# Altium footprint library SMD-RCL.PcbLib: 111 footprints (part 3 of 7)
Each footprint in its own frame and in the unit in brackets; x right, y up, seen from the top. Pads: shape width x height; smd on the part's side, far side on the other; paste and mask are expansions set on the pad; w line width, h text height; cw(c..) or ccw(c..) is an arc to the next point about the centre after c.
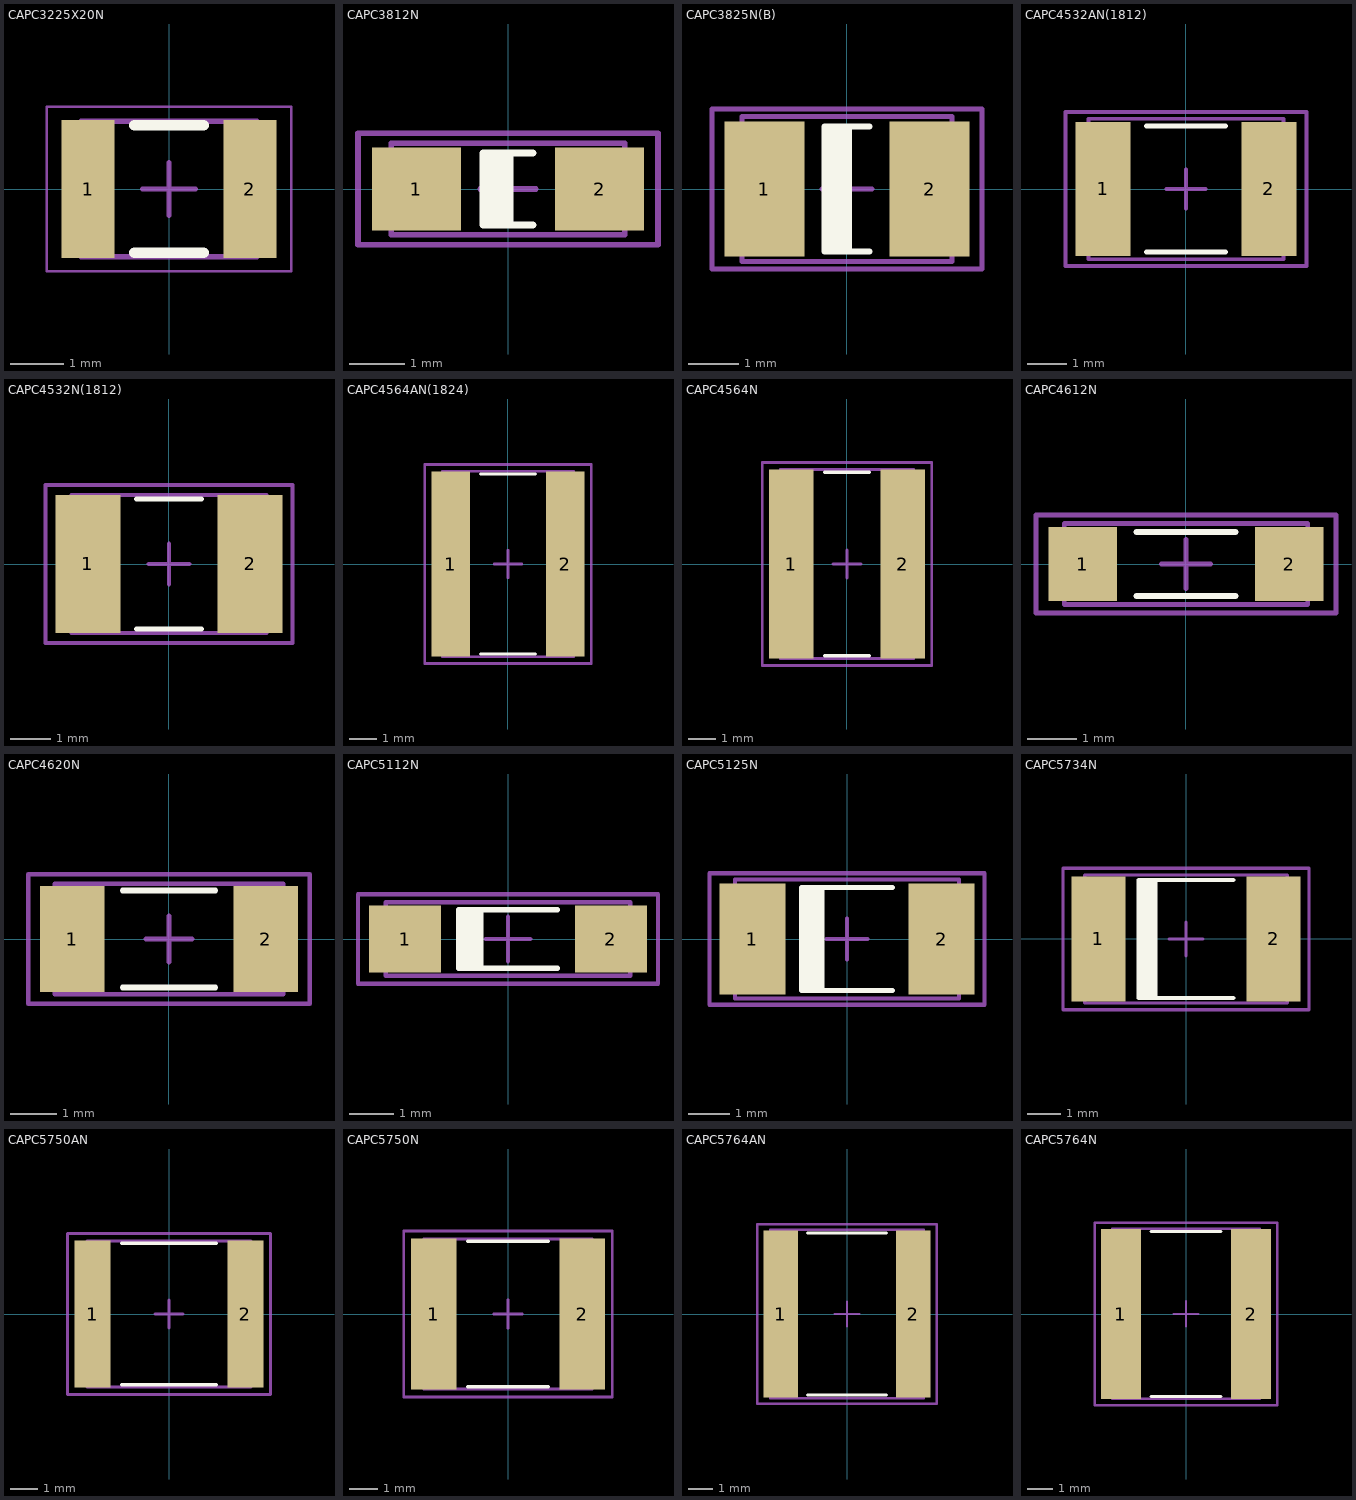
[diagram p2: the footprints below, top view; thin cyan lines are the x and y axes]

## CAPC3225X20N [mm] "Chip Capacitor, 2-Leads, Body 3,25x2,50mm, IPC Medium Density"
height 2
pads (2):
  rect 1x2.6 smd: 1(-1.525,0) 2(1.525,0)
Top Overlay:
  lines w0.2: -0.65,-1.2 0.65,-1.2 ; -0.65,1.2 0.65,1.2
Assembly_draw:
  lines w0.1: -1.65,-1.275 1.65,-1.275 1.65,1.275 -1.65,1.275 -1.65,-1.275
Mechanical_clearance:
  lines w0.05: -2.3,-1.55 2.3,-1.55 2.3,1.55 -2.3,1.55 -2.3,-1.55
  lines w0.1: -0.5,0 0.5,0 ; 0,-0.5 0,0.5
3D body "CAPC3225X20N.step": height 2, standoff 0, extent -1.65,-1.275 1.65,1.275

## CAPC3812N [mm] "Chip Capacitor, Body 3.81x1.27mm, IPC Medium Density"
height 1.66
pads (2):
  rect 1.6x1.5 smd: 1(-1.65,0) 2(1.65,0)
Top Overlay:
  rectangle: -0.45,-0.65 0.1,0.65
  lines w0.125: 0.45,-0.65 -0.45,-0.65 -0.45,0.65 0.45,0.65
Assembly_draw:
  lines w0.1: -2.1,-0.825 -2.1,0.825 2.1,0.825 2.1,-0.825 -2.1,-0.825
Mechanical_clearance:
  lines w0.1: -0.5,0 0.5,0 ; 0,-0.5 0,0.5 ; -2.7,-1 -2.7,1 2.7,1 2.7,-1 -2.7,-1
3D body: height 1.66, standoff 0, extent -2.1,-0.825 2.1,0.825

## CAPC3825N(B) [mm] "Chip Capacitor, Body 3.81x2.54mm, IPC Medium Density"
height 1.66
pads (2):
  rect 1.6x2.7 smd: 1(-1.65,0) 2(1.65,0)
Top Overlay:
  rectangle: -0.45,-1.25 0.1,1.25
  lines w0.125: 0.45,-1.25 -0.45,-1.25 -0.45,1.25 0.45,1.25
Assembly_draw:
  lines w0.1: -2.1,-1.45 2.1,-1.45 2.1,1.45 -2.1,1.45 -2.1,-1.45
Mechanical_clearance:
  lines w0.1: -0.5,0 0.5,0 ; 0,-0.5 0,0.5 ; -2.7,-1.6 2.7,-1.6 2.7,1.6 -2.7,1.6 -2.7,-1.6
3D body: height 1.66, standoff 0, extent -2.1,-1.45 2.1,1.45

## CAPC4532AN(1812) [mm] "Chip Capacitor, Body 4.5x3.2mm, IPC Medium Density"
height 2.03
pads (2):
  rect 1.4x3.4 smd: 1(-2.1,0) 2(2.1,0)
Top Overlay:
  lines w0.125: -1,-1.6 1,-1.6 ; -1,1.6 1,1.6
Assembly_draw:
  lines w0.1: -2.475,-1.78 2.475,-1.78 2.475,1.78 -2.475,1.78 -2.475,-1.78
Mechanical_clearance:
  lines w0.1: -0.5,0 0.5,0 ; 0,-0.5 0,0.5 ; -3.05,-1.95 3.05,-1.95 3.05,1.95 -3.05,1.95 -3.05,-1.95
3D body: height 2.03, standoff 0, extent -2.475,-1.78 2.475,1.78

## CAPC4532N(1812) [mm] "Chip Capacitor, Body 4.5x3.2mm, IPC Medium Density"
height 1.35
pads (2):
  rect 1.6x3.4 smd: 1(-2,0) 2(2,0)
Top Overlay:
  lines w0.125: -0.8,-1.6 0.8,-1.6 ; -0.8,1.6 0.8,1.6
Assembly_draw:
  lines w0.1: -2.4,-1.7 2.4,-1.7 2.4,1.7 -2.4,1.7 -2.4,-1.7
Mechanical_clearance:
  lines w0.1: -0.5,0 0.5,0 ; 0,-0.5 0,0.5 ; -3.05,-1.95 3.05,-1.95 3.05,1.95 -3.05,1.95 -3.05,-1.95
3D body: height 1.35, standoff 0, extent -2.4,-1.7 2.4,1.7

## CAPC4564AN(1824) [mm] "Chip Capacitor, Body 4.5x6.4mm, IPC Medium Density"
height 2.03
pads (2):
  rect 1.4x6.8 smd: 1(-2.1,0) 2(2.1,0)
Top Overlay:
  lines w0.125: -1,-3.3 1,-3.3 ; -1,3.3 1,3.3
Assembly_draw:
  lines w0.1: -2.4,-3.4 2.4,-3.4 2.4,3.4 -2.4,3.4 -2.4,-3.4
Mechanical_clearance:
  lines w0.1: -0.5,0 0.5,0 ; 0,-0.5 0,0.5 ; -3.05,-3.65 3.05,-3.65 3.05,3.65 -3.05,3.65 -3.05,-3.65
3D body: height 2.03, standoff 0, extent -2.4,-3.4 2.4,3.4

## CAPC4564N [mm] "Chip Capacitor, Body 4.5x6.4mm, IPC Medium Density"
height 1.1
pads (2):
  rect 1.6x6.8 smd: 1(-2,0) 2(2,0)
Top Overlay:
  lines w0.125: -0.8,-3.3 0.8,-3.3 ; -0.8,3.3 0.8,3.3
Assembly_draw:
  lines w0.1: -2.4,-3.4 -2.4,3.4 2.4,3.4 2.4,-3.4 -2.4,-3.4
Mechanical_clearance:
  lines w0.1: -0.5,0 0.5,0 ; 0,-0.5 0,0.5 ; -3.05,-3.65 -3.05,3.65 3.05,3.65 3.05,-3.65 -3.05,-3.65
3D body: height 1.1, standoff 0, extent -2.4,-3.4 2.4,3.4

## CAPC4612N [mm] "Chip Capacitor, Body 4.57x1.27mm, IPC Medium Density"
height 1.4
pads (2):
  rect 1.4x1.5 smd: 1(-2.1,0) 2(2.1,0)
Top Overlay:
  lines w0.125: -1,-0.65 1,-0.65 ; -1,0.65 1,0.65
Assembly_draw:
  lines w0.1: -2.475,-0.825 2.475,-0.825 2.475,0.825 -2.475,0.825 -2.475,-0.825
Mechanical_clearance:
  lines w0.1: -0.5,0 0.5,0 ; 0,-0.5 0,0.5 ; -3.05,-1 3.05,-1 3.05,1 -3.05,1 -3.05,-1
3D body: height 1.4, standoff 0, extent -2.475,-0.825 2.475,0.825

## CAPC4620N [mm] "Chip Capacitor, Body 4.6x2.0mm, IPC Medium Density"
height 2.03
pads (2):
  rect 1.4x2.3 smd: 1(-2.1,0) 2(2.1,0)
Top Overlay:
  lines w0.125: -1,-1.05 1,-1.05 ; -1,1.05 1,1.05
Assembly_draw:
  lines w0.1: -2.475,-1.2 2.475,-1.2 2.475,1.2 -2.475,1.2 -2.475,-1.2
Mechanical_clearance:
  lines w0.1: -0.5,0 0.5,0 ; 0,-0.5 0,0.5 ; -3.05,-1.4 3.05,-1.4 3.05,1.4 -3.05,1.4 -3.05,-1.4
3D body: height 2.03, standoff 0, extent -2.475,-1.2 2.475,1.2

## CAPC5112N [mm] "Chip Capacitor, Body 5.08x1.27mm, IPC Medium Density"
height 1.66
pads (2):
  rect 1.6x1.5 smd: 1(-2.3,0) 2(2.3,0)
Top Overlay:
  rectangle: -1.1,-0.65 -0.55,0.65
  lines w0.125: 1.1,-0.65 -1.1,-0.65 -1.1,0.65 1.1,0.65
Assembly_draw:
  lines w0.1: -2.73,-0.825 -2.73,0.825 2.73,0.825 2.73,-0.825 -2.73,-0.825
Mechanical_clearance:
  lines w0.1: -0.5,0 0.5,0 ; 0,-0.5 0,0.5 ; -3.35,-1 -3.35,1 3.35,1 3.35,-1 -3.35,-1
3D body: height 1.66, standoff 0, extent -2.73,-0.825 2.73,0.825

## CAPC5125N [mm] "Chip Capacitor, Body 5.08x2.54mm, IPC Medium Density"
height 1.66
pads (2):
  rect 1.6x2.7 smd: 1(-2.3,0) 2(2.3,0)
Top Overlay:
  rectangle: -1.1,-1.25 -0.55,1.25
  lines w0.125: 1.1,-1.25 -1.1,-1.25 -1.1,1.25 1.1,1.25
Assembly_draw:
  lines w0.1: -2.73,-1.45 -2.73,1.45 2.73,1.45 2.73,-1.45 -2.73,-1.45
Mechanical_clearance:
  lines w0.1: -0.5,0 0.5,0 ; 0,-0.5 0,0.5 ; -3.35,-1.6 -3.35,1.6 3.35,1.6 3.35,-1.6 -3.35,-1.6
3D body: height 1.66, standoff 0, extent -2.73,-1.45 2.73,1.45

## CAPC5734N [mm] "Chip Capacitor, Body 5.7x3.4mm, IPC Medium Density"
height 2.16
pads (2):
  rect 1.6x3.7 smd: 1(-2.6,0) 2(2.6,0)
Top Overlay:
  rectangle: -1.4,-1.75 -0.85,1.75
  lines w0.125: 1.4,-1.75 -1.4,-1.75 -1.4,1.75 1.4,1.75
Assembly_draw:
  lines w0.1: -3,-1.9 3,-1.9 3,1.9 -3,1.9 -3,-1.9
Mechanical_clearance:
  lines w0.1: -0.5,0 0.5,0 ; 0,-0.5 0,0.5 ; -3.65,-2.1 3.65,-2.1 3.65,2.1 -3.65,2.1 -3.65,-2.1
3D body: height 2.16, standoff 0, extent -3,-1.9 3,1.9

## CAPC5750AN [mm] "Chip Capacitor, Body 5.7x5.0mm, IPC Medium Density"
height 1.8
pads (2):
  rect 1.3x5.3 smd: 1(-2.75,0) 2(2.75,0)
Top Overlay:
  lines w0.125: -1.7,-2.55 1.7,-2.55 ; -1.7,2.55 1.7,2.55
Assembly_draw:
  lines w0.1: -2.95,-2.625 2.95,-2.625 2.95,2.625 -2.95,2.625 -2.95,-2.625
Mechanical_clearance:
  lines w0.1: -0.5,0 0.5,0 ; 0,-0.5 0,0.5 ; -3.65,-2.9 3.65,-2.9 3.65,2.9 -3.65,2.9 -3.65,-2.9
3D body: height 1.8, standoff 0, extent -2.95,-2.625 2.95,2.625

## CAPC5750N [mm] "Chip Capacitor, Body 5.7x5.0mm, IPC Medium Density"
height 1.35
pads (2):
  rect 1.6x5.3 smd: 1(-2.6,0) 2(2.6,0)
Top Overlay:
  lines w0.125: -1.4,-2.55 1.4,-2.55 ; -1.4,2.55 1.4,2.55
Assembly_draw:
  lines w0.1: -2.95,-2.625 -2.95,2.625 2.95,2.625 2.95,-2.625 -2.95,-2.625
Mechanical_clearance:
  lines w0.1: -0.5,0 0.5,0 ; 0,-0.5 0,0.5 ; -3.65,-2.9 -3.65,2.9 3.65,2.9 3.65,-2.9 -3.65,-2.9
3D body: height 1.35, standoff 0, extent -2.95,-2.625 2.95,2.625

## CAPC5764AN [mm] "Chip Capacitor, Body 5.7x6.4mm, IPC Medium Density"
height 2.03
pads (2):
  rect 1.4x6.8 smd: 1(-2.7,0) 2(2.7,0)
Top Overlay:
  lines w0.125: -1.6,-3.3 1.6,-3.3 ; -1.6,3.3 1.6,3.3
Assembly_draw:
  lines w0.1: -3.115,-3.43 -3.115,3.43 3.115,3.43 3.115,-3.43 -3.115,-3.43
Mechanical_clearance:
  lines w0.1: -0.5,0 0.5,0 ; 0,-0.5 0,0.5 ; -3.65,-3.65 -3.65,3.65 3.65,3.65 3.65,-3.65 -3.65,-3.65
3D body: height 2.03, standoff 0, extent -3.115,-3.43 3.115,3.43

## CAPC5764N [mm] "Chip Capacitor, Body 5.7x6.4mm, IPC Medium Density"
height 2
pads (2):
  rect 1.6x6.8 smd: 1(-2.6,0) 2(2.6,0)
Top Overlay:
  lines w0.125: -1.4,-3.3 1.4,-3.3 ; -1.4,3.3 1.4,3.3
Assembly_draw:
  lines w0.1: -2.95,-3.4 -2.95,3.4 2.95,3.4 2.95,-3.4 -2.95,-3.4
Mechanical_clearance:
  lines w0.1: -0.5,0 0.5,0 ; 0,-0.5 0,0.5 ; -3.65,-3.65 -3.65,3.65 3.65,3.65 3.65,-3.65 -3.65,-3.65
3D body: height 2, standoff 0, extent -2.95,-3.4 2.95,3.4